# Altium footprint library ST封装.PcbLib: 1336 footprints (part 43 of 109)
Each footprint in its own frame and in the unit in brackets; x right, y up, seen from the top. Pads: shape width x height; smd on the part's side, far side on the other; paste and mask are expansions set on the pad; w line width, h text height; cw(c..) or ccw(c..) is an arc to the next point about the centre after c.
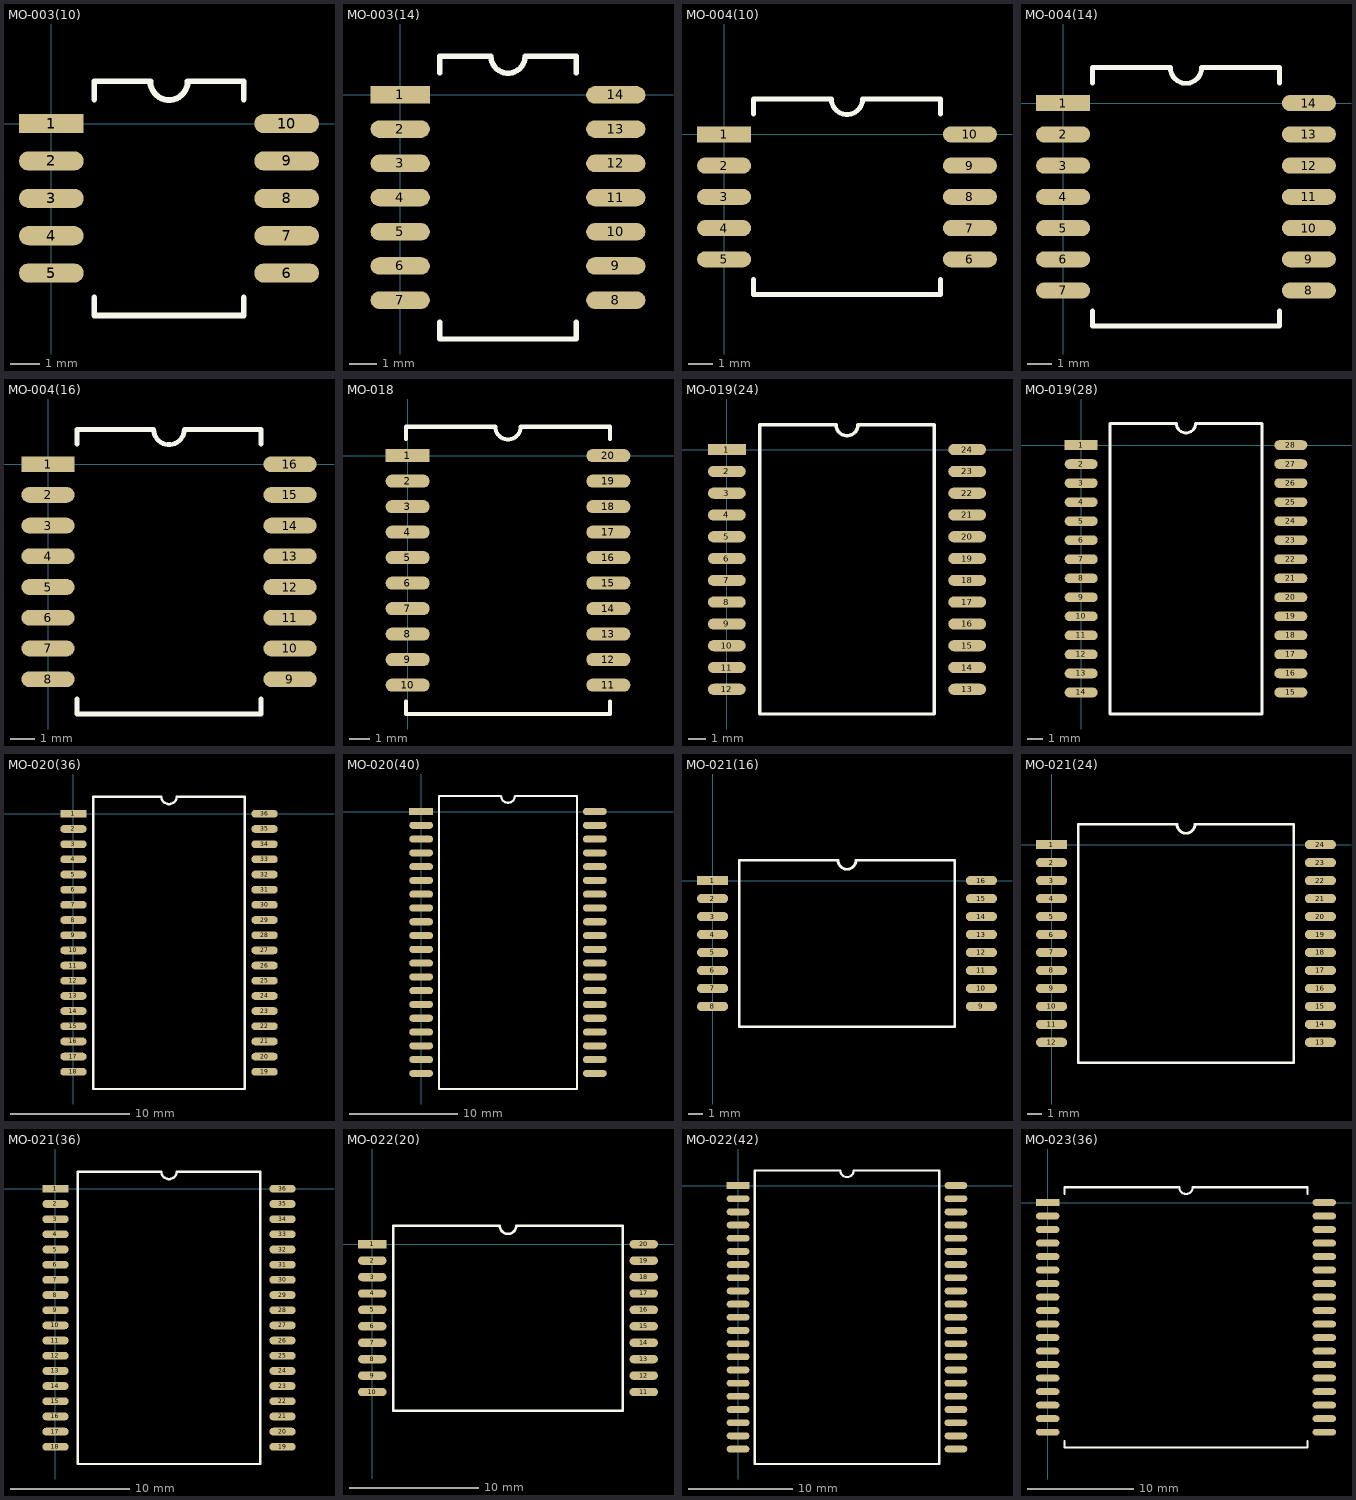
[diagram p42: the footprints below, top view; thin cyan lines are the x and y axes]

## MO-003(10) [mm]
pads (10):
  rect 2.2x0.65 smd: 1(0,0)
  oval 2.2x0.65 smd: 2(0,-1.27) 3(0,-2.54) 4(0,-3.81) 5(0,-5.08) 6(8,-5.08) 7(8,-3.81) 8(8,-2.54) 9(8,-1.27) 10(8,0)
Top Overlay:
  lines w0.2: 1.46,-5.905 1.46,-6.52 6.54,-6.52 6.54,-5.905 ; 1.46,0.825 1.46,1.44 3.365,1.44 ccw(c4,1.44) 4.635,1.44 6.54,1.44 6.54,0.825

## MO-003(14) [mm]
pads (14):
  rect 2.2x0.65 smd: 1(0,0)
  oval 2.2x0.65 smd: 2(0,-1.27) 3(0,-2.54) 4(0,-3.81) 5(0,-5.08) 6(0,-6.35) 7(0,-7.62) 8(8,-7.62) 9(8,-6.35) 10(8,-5.08) 11(8,-3.81) 12(8,-2.54) 13(8,-1.27) 14(8,0)
Top Overlay:
  lines w0.2: 1.46,-8.445 1.46,-9.06 6.54,-9.06 6.54,-8.445 ; 1.46,0.825 1.46,1.44 3.365,1.44 ccw(c4,1.44) 4.635,1.44 6.54,1.44 6.54,0.825

## MO-004(10) [mm]
pads (10):
  rect 2.2x0.65 smd: 1(0,0)
  oval 2.2x0.65 smd: 2(0,-1.27) 3(0,-2.54) 4(0,-3.81) 5(0,-5.08) 6(10,-5.08) 7(10,-3.81) 8(10,-2.54) 9(10,-1.27) 10(10,0)
Top Overlay:
  lines w0.2: 1.19,-5.905 1.19,-6.52 8.81,-6.52 8.81,-5.905 ; 1.19,0.825 1.19,1.44 4.365,1.44 ccw(c5,1.44) 5.635,1.44 8.81,1.44 8.81,0.825

## MO-004(14) [mm]
pads (14):
  rect 2.2x0.65 smd: 1(0,0)
  oval 2.2x0.65 smd: 2(0,-1.27) 3(0,-2.54) 4(0,-3.81) 5(0,-5.08) 6(0,-6.35) 7(0,-7.62) 8(10,-7.62) 9(10,-6.35) 10(10,-5.08) 11(10,-3.81) 12(10,-2.54) 13(10,-1.27) 14(10,0)
Top Overlay:
  lines w0.2: 1.19,-8.445 1.19,-9.06 8.81,-9.06 8.81,-8.445 ; 1.19,0.825 1.19,1.44 4.365,1.44 ccw(c5,1.44) 5.635,1.44 8.81,1.44 8.81,0.825

## MO-004(16) [mm]
pads (16):
  rect 2.2x0.65 smd: 1(0,0)
  oval 2.2x0.65 smd: 2(0,-1.27) 3(0,-2.54) 4(0,-3.81) 5(0,-5.08) 6(0,-6.35) 7(0,-7.62) 8(0,-8.89) 9(10,-8.89) 10(10,-7.62) 11(10,-6.35) 12(10,-5.08) 13(10,-3.81) 14(10,-2.54) 15(10,-1.27) 16(10,0)
Top Overlay:
  lines w0.2: 1.19,-9.715 1.19,-10.33 8.81,-10.33 8.81,-9.715 ; 1.19,0.825 1.19,1.44 4.365,1.44 ccw(c5,1.44) 5.635,1.44 8.81,1.44 8.81,0.825

## MO-018 [mm]
pads (20):
  rect 2.2x0.65 smd: 1(0,0)
  oval 2.2x0.65 smd: 2(0,-1.27) 3(0,-2.54) 4(0,-3.81) 5(0,-5.08) 6(0,-6.35) 7(0,-7.62) 8(0,-8.89) 9(0,-10.16) 10(0,-11.43) 11(10,-11.43) 12(10,-10.16) 13(10,-8.89) 14(10,-7.62) 15(10,-6.35) 16(10,-5.08) 17(10,-3.81) 18(10,-2.54) 19(10,-1.27) 20(10,0)
Top Overlay:
  lines w0.2: -0.08,-12.255 -0.08,-12.87 10.08,-12.87 10.08,-12.255 ; -0.08,0.825 -0.08,1.44 4.365,1.44 ccw(c5,1.44) 5.635,1.44 10.08,1.44 10.08,0.825

## MO-019(24) [mm]
pads (24):
  rect 2.2x0.65 smd: 1(0,0)
  oval 2.2x0.65 smd: 2(0,-1.27) 3(0,-2.54) 4(0,-3.81) 5(0,-5.08) 6(0,-6.35) 7(0,-7.62) 8(0,-8.89) 9(0,-10.16) 10(0,-11.43) 11(0,-12.7) 12(0,-13.97) 13(14,-13.97) 14(14,-12.7) 15(14,-11.43) 16(14,-10.16) 17(14,-8.89) 18(14,-7.62) 19(14,-6.35) 20(14,-5.08) 21(14,-3.81) 22(14,-2.54) 23(14,-1.27) 24(14,0)
Top Overlay:
  lines w0.2: 1.92,-15.41 12.08,-15.41 12.08,-6.985 12.08,1.44 7.635,1.44 cw(c7,1.44) 6.365,1.44 1.92,1.44 1.92,-6.985 1.92,-15.41

## MO-019(28) [mm]
pads (28):
  rect 2.2x0.65 smd: 1(0,0)
  oval 2.2x0.65 smd: 2(0,-1.27) 3(0,-2.54) 4(0,-3.81) 5(0,-5.08) 6(0,-6.35) 7(0,-7.62) 8(0,-8.89) 9(0,-10.16) 10(0,-11.43) 11(0,-12.7) 12(0,-13.97) 13(0,-15.24) 14(0,-16.51) 15(14,-16.51) 16(14,-15.24) 17(14,-13.97) 18(14,-12.7) 19(14,-11.43) 20(14,-10.16) 21(14,-8.89) 22(14,-7.62) 23(14,-6.35) 24(14,-5.08) 25(14,-3.81) 26(14,-2.54) 27(14,-1.27) 28(14,0)
Top Overlay:
  lines w0.2: 1.92,-17.95 1.92,-8.255 1.92,1.44 6.365,1.44 ccw(c7,1.44) 7.635,1.44 12.08,1.44 12.08,-8.255 12.08,-17.95 1.92,-17.95

## MO-020(36) [mm]
pads (36):
  rect 2.2x0.65 smd: 1(0,0)
  oval 2.2x0.65 smd: 2(0,-1.27) 3(0,-2.54) 4(0,-3.81) 5(0,-5.08) 6(0,-6.35) 7(0,-7.62) 8(0,-8.89) 9(0,-10.16) 10(0,-11.43) 11(0,-12.7) 12(0,-13.97) 13(0,-15.24) 14(0,-16.51) 15(0,-17.78) 16(0,-19.05) 17(0,-20.32) 18(0,-21.59) 19(16,-21.59) 20(16,-20.32) 21(16,-19.05) 22(16,-17.78) 23(16,-16.51) 24(16,-15.24) 25(16,-13.97) 26(16,-12.7) 27(16,-11.43) 28(16,-10.16) 29(16,-8.89) 30(16,-7.62) 31(16,-6.35) 32(16,-5.08) 33(16,-3.81) 34(16,-2.54) 35(16,-1.27) 36(16,0)
Top Overlay:
  lines w0.2: 1.65,-23.03 1.65,-10.795 1.65,1.44 7.365,1.44 ccw(c8,1.44) 8.635,1.44 14.35,1.44 14.35,-10.795 14.35,-23.03 1.65,-23.03

## MO-020(40) [mm]
pads (40):
  rect 2.2x0.65 smd: 1(0,0)
  oval 2.2x0.65 smd: 2(0,-1.27) 3(0,-2.54) 4(0,-3.81) 5(0,-5.08) 6(0,-6.35) 7(0,-7.62) 8(0,-8.89) 9(0,-10.16) 10(0,-11.43) 11(0,-12.7) 12(0,-13.97) 13(0,-15.24) 14(0,-16.51) 15(0,-17.78) 16(0,-19.05) 17(0,-20.32) 18(0,-21.59) 19(0,-22.86) 20(0,-24.13) 21(16,-24.13) 22(16,-22.86) 23(16,-21.59) 24(16,-20.32) 25(16,-19.05) 26(16,-17.78) 27(16,-16.51) 28(16,-15.24) 29(16,-13.97) 30(16,-12.7) 31(16,-11.43) 32(16,-10.16) 33(16,-8.89) 34(16,-7.62) 35(16,-6.35) 36(16,-5.08) 37(16,-3.81) 38(16,-2.54) 39(16,-1.27) 40(16,0)
Top Overlay:
  lines w0.2: 1.65,-25.57 1.65,-12.065 1.65,1.44 7.365,1.44 ccw(c8,1.44) 8.635,1.44 14.35,1.44 14.35,-12.065 14.35,-25.57 1.65,-25.57

## MO-021(16) [mm]
pads (16):
  rect 2.2x0.65 smd: 1(0,0)
  oval 2.2x0.65 smd: 2(0,-1.27) 3(0,-2.54) 4(0,-3.81) 5(0,-5.08) 6(0,-6.35) 7(0,-7.62) 8(0,-8.89) 9(19,-8.89) 10(19,-7.62) 11(19,-6.35) 12(19,-5.08) 13(19,-3.81) 14(19,-2.54) 15(19,-1.27) 16(19,0)
Top Overlay:
  lines w0.2: 1.88,-10.33 17.12,-10.33 17.12,-4.445 17.12,1.44 10.135,1.44 cw(c9.5,1.44) 8.865,1.44 1.88,1.44 1.88,-4.445 1.88,-10.33

## MO-021(24) [mm]
pads (24):
  rect 2.2x0.65 smd: 1(0,0)
  oval 2.2x0.65 smd: 2(0,-1.27) 3(0,-2.54) 4(0,-3.81) 5(0,-5.08) 6(0,-6.35) 7(0,-7.62) 8(0,-8.89) 9(0,-10.16) 10(0,-11.43) 11(0,-12.7) 12(0,-13.97) 13(19,-13.97) 14(19,-12.7) 15(19,-11.43) 16(19,-10.16) 17(19,-8.89) 18(19,-7.62) 19(19,-6.35) 20(19,-5.08) 21(19,-3.81) 22(19,-2.54) 23(19,-1.27) 24(19,0)
Top Overlay:
  lines w0.2: 1.88,-15.41 17.12,-15.41 17.12,-6.985 17.12,1.44 10.135,1.44 cw(c9.5,1.44) 8.865,1.44 1.88,1.44 1.88,-6.985 1.88,-15.41

## MO-021(36) [mm]
pads (36):
  rect 2.2x0.65 smd: 1(0,0)
  oval 2.2x0.65 smd: 2(0,-1.27) 3(0,-2.54) 4(0,-3.81) 5(0,-5.08) 6(0,-6.35) 7(0,-7.62) 8(0,-8.89) 9(0,-10.16) 10(0,-11.43) 11(0,-12.7) 12(0,-13.97) 13(0,-15.24) 14(0,-16.51) 15(0,-17.78) 16(0,-19.05) 17(0,-20.32) 18(0,-21.59) 19(19,-21.59) 20(19,-20.32) 21(19,-19.05) 22(19,-17.78) 23(19,-16.51) 24(19,-15.24) 25(19,-13.97) 26(19,-12.7) 27(19,-11.43) 28(19,-10.16) 29(19,-8.89) 30(19,-7.62) 31(19,-6.35) 32(19,-5.08) 33(19,-3.81) 34(19,-2.54) 35(19,-1.27) 36(19,0)
Top Overlay:
  lines w0.2: 1.88,-23.03 17.12,-23.03 17.12,-10.795 17.12,1.44 10.135,1.44 cw(c9.5,1.44) 8.865,1.44 1.88,1.44 1.88,-10.795 1.88,-23.03

## MO-022(20) [mm]
pads (20):
  rect 2.2x0.65 smd: 1(0,0)
  oval 2.2x0.65 smd: 2(0,-1.27) 3(0,-2.54) 4(0,-3.81) 5(0,-5.08) 6(0,-6.35) 7(0,-7.62) 8(0,-8.89) 9(0,-10.16) 10(0,-11.43) 11(21,-11.43) 12(21,-10.16) 13(21,-8.89) 14(21,-7.62) 15(21,-6.35) 16(21,-5.08) 17(21,-3.81) 18(21,-2.54) 19(21,-1.27) 20(21,0)
Top Overlay:
  lines w0.2: 1.61,-12.87 1.61,-5.715 1.61,1.44 9.865,1.44 ccw(c10.5,1.44) 11.135,1.44 19.39,1.44 19.39,-5.715 19.39,-12.87 1.61,-12.87

## MO-022(42) [mm]
pads (42):
  rect 2.2x0.65 smd: 1(0,0)
  oval 2.2x0.65 smd: 2(0,-1.27) 3(0,-2.54) 4(0,-3.81) 5(0,-5.08) 6(0,-6.35) 7(0,-7.62) 8(0,-8.89) 9(0,-10.16) 10(0,-11.43) 11(0,-12.7) 12(0,-13.97) 13(0,-15.24) 14(0,-16.51) 15(0,-17.78) 16(0,-19.05) 17(0,-20.32) 18(0,-21.59) 19(0,-22.86) 20(0,-24.13) 21(0,-25.4) 22(21,-25.4) 23(21,-24.13) 24(21,-22.86) 25(21,-21.59) 26(21,-20.32) 27(21,-19.05) 28(21,-17.78) 29(21,-16.51) 30(21,-15.24) 31(21,-13.97) 32(21,-12.7) 33(21,-11.43) 34(21,-10.16) 35(21,-8.89) 36(21,-7.62) 37(21,-6.35) 38(21,-5.08) 39(21,-3.81) 40(21,-2.54) 41(21,-1.27) 42(21,0)
Top Overlay:
  lines w0.2: 1.61,-26.84 19.39,-26.84 19.39,-12.7 19.39,1.44 11.135,1.44 cw(c10.5,1.44) 9.865,1.44 1.61,1.44 1.61,-12.7 1.61,-26.84

## MO-023(36) [mm]
pads (36):
  rect 2.2x0.65 smd: 1(0,0)
  oval 2.2x0.65 smd: 2(0,-1.27) 3(0,-2.54) 4(0,-3.81) 5(0,-5.08) 6(0,-6.35) 7(0,-7.62) 8(0,-8.89) 9(0,-10.16) 10(0,-11.43) 11(0,-12.7) 12(0,-13.97) 13(0,-15.24) 14(0,-16.51) 15(0,-17.78) 16(0,-19.05) 17(0,-20.32) 18(0,-21.59) 19(26,-21.59) 20(26,-20.32) 21(26,-19.05) 22(26,-17.78) 23(26,-16.51) 24(26,-15.24) 25(26,-13.97) 26(26,-12.7) 27(26,-11.43) 28(26,-10.16) 29(26,-8.89) 30(26,-7.62) 31(26,-6.35) 32(26,-5.08) 33(26,-3.81) 34(26,-2.54) 35(26,-1.27) 36(26,0)
Top Overlay:
  lines w0.2: 1.57,-22.415 1.57,-23.03 24.43,-23.03 24.43,-22.415 ; 1.57,0.825 1.57,1.44 12.365,1.44 ccw(c13,1.44) 13.635,1.44 24.43,1.44 24.43,0.825